# Altium footprint library custom.PcbLib: 330 footprints (part 1 of 21)
Each footprint in its own frame and in the unit in brackets; x right, y up, seen from the top. Pads: shape width x height; smd on the part's side, far side on the other; paste and mask are expansions set on the pad; w line width, h text height; cw(c..) or ccw(c..) is an arc to the next point about the centre after c.
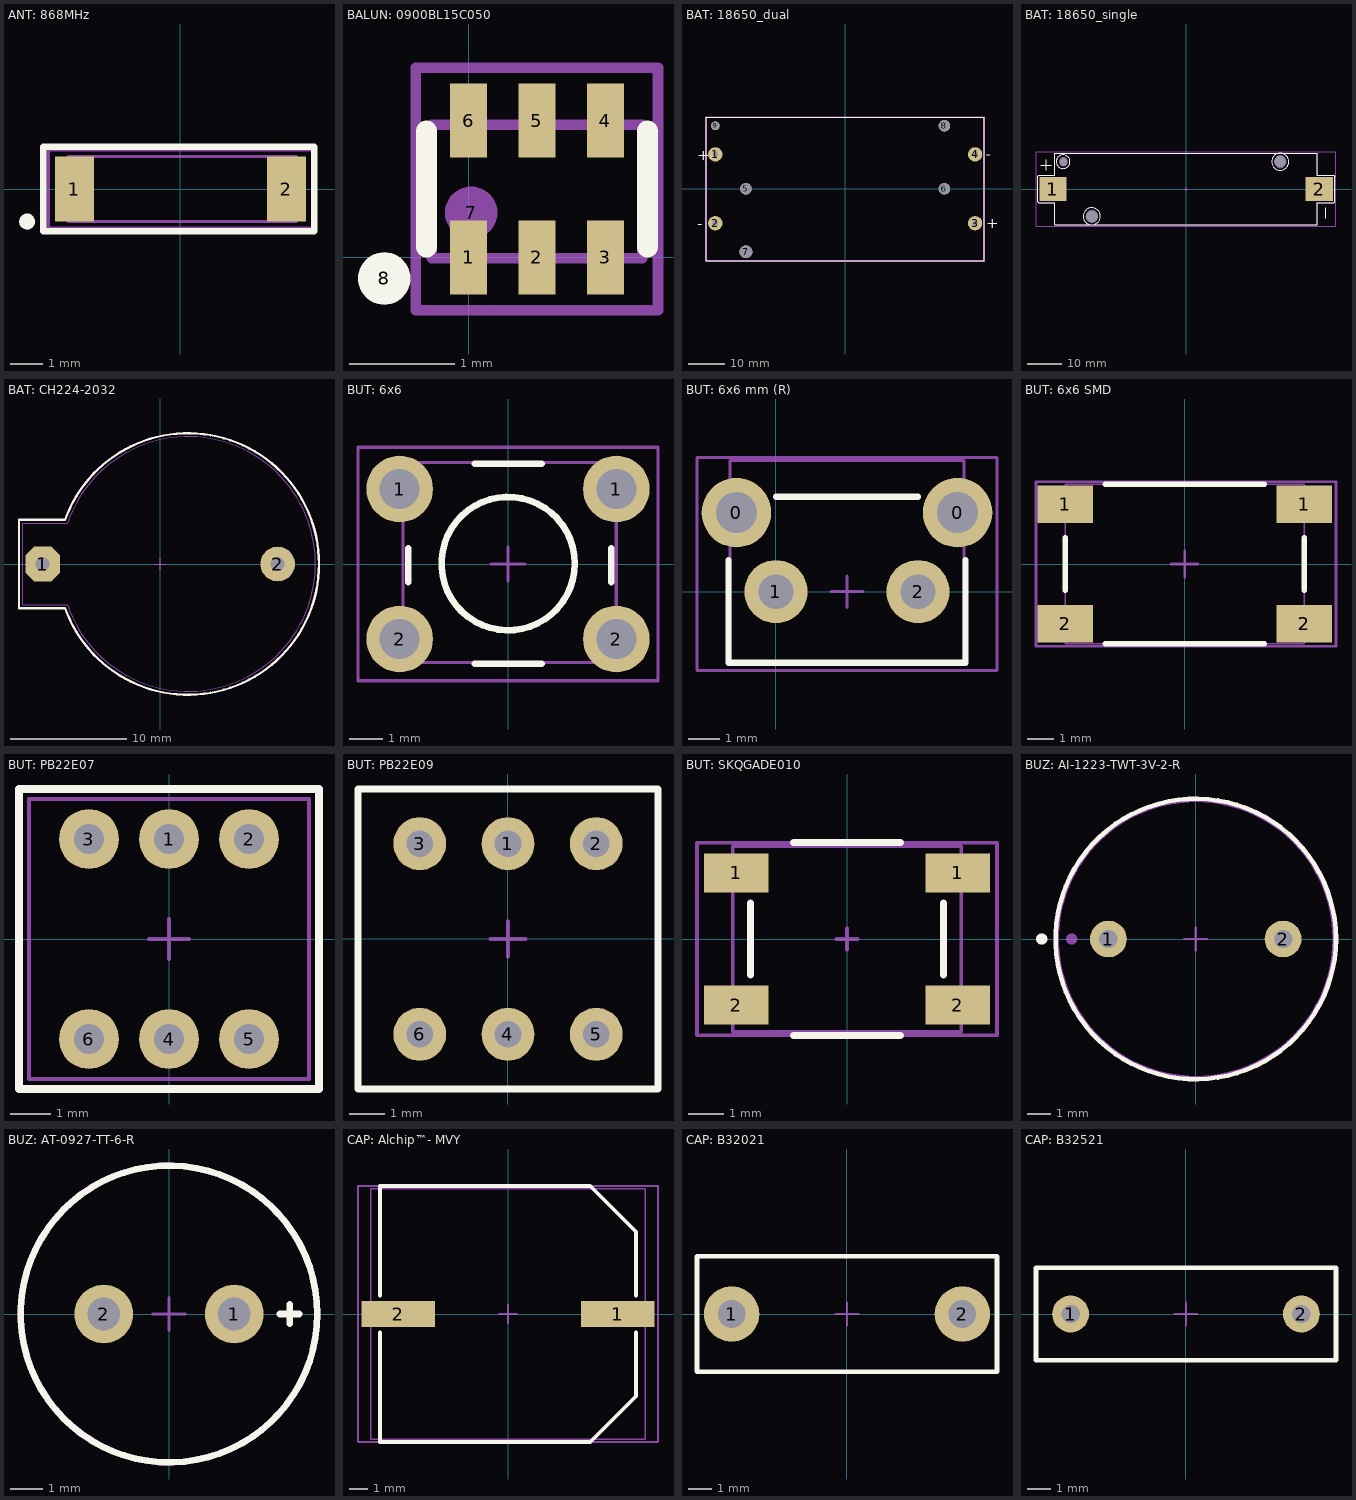
[diagram p0: the footprints below, top view; thin cyan lines are the x and y axes]

## ANT: 868MHz [mm]
height 1.2
pads (4):
  rect 1.2x2 smd: 1(-3.25,0) 2(3.25,0)
  round 0.5 on Top Overlay: ""(-4.7,-1)
  round 0.5 on Mech1: ""(-3.05,0.6)
Top Overlay:
  lines w0.2: -4.2,-1.3 -4.2,1.3 4.1,1.3 4.1,-1.3 -4.2,-1.3
Top Assy:
  lines w0.1: -3.45,-1 -3.45,1 3.55,1 3.55,-1 -3.45,-1
Size Area:
  lines w0.1: -4.05,-1.2 4.05,-1.2 4.05,1.2 -4.05,1.2 -4.05,-1.2
3D body "User Library-0868AT43A0020.STEP": height 0.8, standoff 0, extent -3.45,-1 3.55,1

## BALUN: 0900BL15C050 [mm]
pads (8):
  rect 0.35x0.7 smd: 1(0,0) 2(0.65,0) 3(1.3,0) 4(1.3,1.3) 5(0.65,1.3) 6(0,1.3)
  round 0.5 on Mech1: 7(0.025,0.425)
  round 0.5 on Top Overlay: 8(-0.8,-0.2)
Top Overlay:
  lines w0.2: -0.4,0.1 -0.4,1.2 ; 1.7,0.1 1.7,1.2
Top Assy:
  lines w0.1: -0.35,-0.01 1.65,-0.01 1.65,1.26 -0.35,1.26 -0.35,-0.01
Size Area:
  lines w0.1: -0.5,-0.5 1.8,-0.5 1.8,1.8 -0.5,1.8 -0.5,-0.5
3D body "User Library-1600BL15B100E.STEP": height 0.84, standoff -0.02, extent -0.35,-0.01 1.65,1.26

## BAT: 18650_dual [mm] "Holder for Dual 18650 Batteries P/N 1049"
height 20
pads (9):
  round 4 hole 1.5: 1(-36.11,9.565) 2(-36.11,-9.565) 3(36.11,-9.565) 4(36.11,9.565)
  round 3.2 hole 3.2: 5(-27.6,0) 6(27.6,0) 8(27.6,17.515)
  round 3.55 hole 3.55: 7(-27.6,-17.515)
  round 2.4 hole 2.4: 9(-36.11,17.515)
Top Overlay:
  lines w0.2: -38.6,-20 38.6,-20 38.6,19.9 -38.6,19.9 -38.6,-20
  text "-" at 39.1,8.2 h3
  text "+" at 39.2,-10.9 h3
  text "-" at -41.1,-11.1 h3
  text "+" at -41.2,8 h3
Top Assy:
  lines w0.05: -38.51,-19.923 38.546,-19.923 38.546,19.85 -38.51,19.85 -38.51,-19.923
  lines w0.1: -38.51,19.85 -38.51,-19.923 38.546,-19.923 38.546,19.85 38.543,19.853 -38.51,19.853
Size Area:
  lines w0.1: 38.256,20.1 -38.8,20.1 -38.8,-20.2 38.8,-20.2 38.8,20.1
3D body "keystone-PN1049.STEP": height 15.78, standoff -2.61, extent -38.51,-19.923 38.546,19.853

## BAT: 18650_single [mm]
height 22
pads (5):
  round 1.524 hole 2.4: 0(-35.93,8)
  round 1.524 hole 3.5: 0(-27.6,-8) 0(27.6,8)
  rect 8x7 smd: 1(-39,0) 2(39,0)
Top Overlay:
  circle w0.2: c-36,8 r2
  circle w0.2: c-27.6,-8 r2.5
  circle w0.2: c27.6,8 r2.5
  lines w0.2: -42.5,7 -39.5,7 ; -41,5.5 -41,8.5 ; 41,-8.5 41,-5.5 ; 43.5,-3.7 43.5,3.7 ; 43.5,-3.7 43.2,-4 38.5,-4 38.5,-10.5 -38.5,-10.5 -38.5,-4 -43.2,-4 -43.5,-3.7 -43.5,3.7 -43.2,4 -38.5,4 -38.5,10.5 38.5,10.5 38.5,4 43.2,4 43.5,3.7 ; 43.5,-3.7 43.5,3.7
Top Assy:
  circle w0.254: c27.6,8 r1.75
  circle w0.254: c-27.6,-8 r1.75
  circle w0.254: c-35.93,8 r1.2
  lines w0.1: -43.5,-3.7 -43.2,-4 -38.5,-4 -38.5,-10.5 38.5,-10.5 38.5,-4 43.2,-4 43.5,-3.7 43.5,3.7 43.2,4 38.5,4 38.5,10.5 -38.5,10.5 -38.5,4 -43.2,4 -43.5,3.7 -43.5,-3.7
Size Area:
  lines w0.1: -0.5,0 0.5,0 ; 0,-0.5 0,0.5 ; -43.953,-10.922 43.931,-10.922 43.931,10.922 -43.953,10.922 -43.953,-10.922
3D body "keystone-PN1042.STEP": height 15.01, standoff -3.28, extent -43,-10.35 43.004,10.3

## BAT: CH224-2032 [mm] "Батарейный отсек для элемента 2032"
height 9
pads (2):
  oct 3x3 hole 1.2: 1(-10.151,0)
  round 3 hole 1.2: 2(10.152,0)
Top Overlay:
  lines w0.2: -8.255,-3.81 -12.192,-3.81 -12.192,3.81 -8.255,3.81 ; -8.221,-3.798 ccw(c2.422,0) -8.221,3.798
Top Assy:
  lines w0.1: -7.992,-3.5 -11.848,-3.5 -11.848,3.5 -7.992,3.5 ; -7.989,-3.552 ccw(c2.422,0) -7.989,3.552
Size Area:
  lines w0.1: -8.255,-3.81 -12.192,-3.81 -12.192,3.81 -8.255,3.81 ; -8.221,-3.798 ccw(c2.422,0) -8.221,3.798 ; -0.5,0 0.5,0 ; 0,-0.5 0,0.5
3D body "CH224-2032.step": height 8.5, standoff -4, extent -11.079,-11 13.421,11

## BUT: 6x6 [mm] "Leaded Tactile Button 6x6"
height 5
pads (4):
  round 2 hole 1.2: 1(-3.25,2.25) 1(3.25,2.25) 2(-3.25,-2.25) 2(3.25,-2.25)
Top Overlay:
  circle w0.2: c0.004,0.012 r2
  lines w0.2: -2.996,-0.544 -2.996,0.472 ; -0.996,-2.988 1.004,-2.988 ; -0.996,3.012 1.004,3.012 ; 3.1,-0.544 3.1,0.472
Top Assy:
  lines w0.1: -3.148,-2.957 3.252,-2.957 3.252,3.043 -3.148,3.043 -3.148,-2.957
Size Area:
  lines w0.1: -0.5,0 0.5,0 ; 0,-0.5 0,0.5 ; -4.5,-3.5 -4.5,3.5 4.5,3.5 4.5,-3.5 -4.5,-3.5
3D body "кнопка_тактовая_6х6х1.STEP": height 4.5, standoff -0.9, extent -3.148,-2.957 3.252,3.043

## BUT: 6x6 mm (R) [mm]
height 7.4
pads (4):
  round 2.2 hole 1.3: 0(-1.25,2.5) 0(5.75,2.5)
  round 2 hole 1.1: 1(0,0) 2(4.5,0)
Top Overlay:
  lines w0.2: -1.5,1 -1.5,-2.25 6,-2.25 6,1 ; 0,3 4.5,3
Top Assy:
  lines w0.1: -1.45,-2.3 5.95,-2.3 5.95,4.15 -1.45,4.15 -1.45,-2.3
Size Area:
  lines w0.1: 1.75,0 2.25,0 ; 2.25,-0.5 2.25,0 ; 2.25,0.5 2.25,0 ; 2.75,0 2.25,0 ; -2.5,-2.5 7,-2.5 7,4.25 -2.5,4.25 -2.5,-2.5
3D body "User Library-SWITCH, TACTILE, RIGHT ANGLE, 12VDC, 50MA, 6_85MM ACTUATOR, WEALTH METAL TC-0244Z-1.STEP": height 7, standoff -4, extent -1.45,-6.85 5.95,4.15

## BUT: 6x6 SMD [mm] "Leaded Tactile Button 6x6"
height 9
pads (4):
  rect 2.1x1.4 smd: 1(-4.5,2.25) 1(4.5,2.25) 2(-4.5,-2.25) 2(4.5,-2.25)
Top Overlay:
  lines w0.2: -4.5,-1 -4.5,1 ; -3,-3 3,-3 ; -3,3 3,3 ; 4.5,-1 4.5,1
Top Assy:
  lines w0.05: -4.5,-3 -4.5,3 4.5,3 4.5,-3 -4.5,-3
Size Area:
  lines w0.1: -0.5,0 0.5,0 ; 0,-0.5 0,0.5 ; -5.6,-3.1 5.7,-3.1 5.7,3.1 -5.6,3.1 -5.6,-3.1
3D body "User Library-PTS645SL43SMTR92-LFS.STEP": height 4.3, standoff 0, extent -4.5,-3 4.5,3

## BUT: PB22E07 [mm] "DPDT, 7x7"
height 12.3
pads (6):
  round 1.5 hole 0.762: 1(0,2.5) 2(2,2.5) 3(-2,2.5) 4(0,-2.5) 5(2,-2.5) 6(-2,-2.5)
Top Overlay:
  lines w0.2: -3.75,-3.75 -3.75,3.75 3.75,3.75 3.75,-3.75 -3.75,-3.75
Top Assy:
  lines w0.1: -3.5,-3.5 -3.5,3.5 3.5,3.5 3.5,-3.5 -3.5,-3.5
Size Area:
  lines w0.1: -0.5,0 0.5,0 ; 0,-0.5 0,0.5 ; -3.75,-3.75 -3.75,3.75 3.75,3.75 3.75,-3.75 -3.75,-3.75
3D body "PB22E07.STEP": height 12.6, standoff -2, extent -3.5,-3.5 3.5,3.5

## BUT: PB22E09 [mm] "DPDT, 8.5x8.5x14"
height 14
pads (6):
  round 1.5 hole 0.762: 1(0,2.7) 2(2.5,2.7) 3(-2.5,2.7) 4(0,-2.7) 5(2.5,-2.7) 6(-2.5,-2.7)
Top Overlay:
  lines w0.2: -4.25,-4.25 4.25,-4.25 4.25,4.25 -4.25,4.25 -4.25,-4.25
Top Assy:
  lines w0.1: -4.25,-4.25 4.25,-4.25 4.25,4.25 -4.25,4.25 -4.25,-4.25
Size Area:
  lines w0.1: -0.5,0 0.5,0 ; 0,-0.5 0,0.5 ; -4.25,-4.25 -4.25,4.25 4.25,4.25 4.25,-4.25 -4.25,-4.25
3D body "PB22E09.STEP": height 14, standoff -2, extent -4.25,-4.25 4.25,4.25

## BUT: SKQGADE010 [mm]
pads (4):
  rect 1.8x1.1 smd: 1(-3.1,1.85) 1(3.1,1.85) 2(-3.1,-1.85) 2(3.1,-1.85)
Top Overlay:
  lines w0.2: -2.7,-1 -2.7,1 ; -1.5,-2.7 1.5,-2.7 ; -1.5,2.7 1.5,2.7 ; 2.7,-1 2.7,1
Top Assy:
  lines w0.1: -3.2,-2.6 3.2,-2.6 3.2,2.6 -3.2,2.6 -3.2,-2.6
Size Area:
  lines w0.1: -0.3,0 0.3,0 ; 0,-0.3 0,0.3 ; -4.2,-2.7 4.2,-2.7 4.2,2.7 -4.2,2.7 -4.2,-2.7
3D body "User Library-4x4_SMD_Switch.STEP": height 1.45, standoff -0.05, extent -3.2,-2.6 3.2,2.6

## BUZ: AI-1223-TWT-3V-2-R [mm]
pads (4):
  round 1.6 hole 0.8: 1(-3.8,0) 2(3.8,0)
  round 0.5 on Top Overlay: ""(-6.7,0)
  round 0.5 on Mech1: ""(-5.4,0)
Top Overlay:
  circle w0.2: c0,0 r6.1
Top Assy:
  circle w0.1: c0,0 r6
Size Area:
  circle w0.1: c0,0 r6
  lines w0.1: -0.5,0 0.5,0 ; 0,-0.5 0,0.5
3D body "AI-1223-TWT-3V-2-R.STEP": height 7.55, standoff -2, extent -6,-6 6,6

## BUZ: AT-0927-TT-6-R [mm]
pads (2):
  round 1.8 hole 1: 1(2,0) 2(-2,0)
Top Overlay:
  circle w0.2: c0,0 r4.55
  lines w0.2: 3.4,0 4,0 ; 3.7,-0.3 3.7,0.3
Top Assy:
  circle w0.1: c0,0 r4.5
  lines w0.1: 3.4,0 4,0 ; 3.7,-0.3 3.7,0.3
Size Area:
  circle w0.1: c0,0 r4.6
  lines w0.1: -0.5,0 0.5,0 ; 0,-0.5 0,0.5
3D body "AT-0927-TT-6-R.STEP": height 4.52, standoff -2.5, extent -4.5,-4.5 4.5,4.5

## CAP: Alchip™- MVY [mm]
pads (2):
  rect 4x1.4 smd: 1(6,0) 2(-6,0)
Top Overlay:
  lines w0.2: -7,-1 -7,-7 4.5,-7 7,-4.5 7,-1 ; -7,1 -7,7 4.5,7 7,4.5 7,1
Top Assy:
  lines w0.1: -6.5,0 -5.5,0 ; -6,-0.5 -6,0.5 ; -7.5,-6.85 -7.5,6.85 7.501,6.85 7.501,-6.85 -7.5,-6.85
Size Area:
  lines w0.1: -0.5,0 0.5,0 ; 0,-0.5 0,0.5 ; -8.2,-7 8.2,-7 8.2,7 -7.6,7 -8.2,7 -8.2,0 -8.2,-7
3D body "User Library-CAP_AL_EL_SMT_13x14.STEP": height 14, standoff 0, extent -7.5,-6.85 7.501,6.85

## CAP: B32021 [mm]
pads (2):
  round 2.4 hole 1.2: 1(-5,0) 2(5,0)
Top Overlay:
  lines w0.2: -6.5,-2.5 6.5,-2.5 6.5,2.5 -6.5,2.5 -6.5,-2.5
Top Assy:
  lines w0.1: -6.5,-2.5 6.5,-2.5 6.5,2.5 -6.5,2.5 -6.5,-2.5
Size Area:
  lines w0.1: -0.5,0 0.5,0 ; 0,-0.5 0,0.5 ; -6.5,-2.5 -6.5,2.5 6.5,2.5 6.5,-2.5 -6.5,-2.5
3D body "CAPRR1000W60L1300T500H1100.STEP": height 10.7, standoff -2.75, extent -6.5,-2.5 6.5,2.5

## CAP: B32521 [mm]
pads (2):
  round 1.6 hole 0.8: 1(-5,0) 2(5,0)
Top Overlay:
  lines w0.2: -6.5,-2 -6.5,2 6.5,2 6.5,-2 -6.5,-2
Top Assy:
  lines w0.1: -6.5,-2 6.5,-2 6.5,2 -6.5,2 -6.5,-2
Size Area:
  lines w0.1: -0.5,0 0.5,0 ; 0,-0.5 0,0.5 ; -6.5,-2 6.5,-2 6.5,2 -6.5,2 -6.5,-2
3D body "B32521.STEP": height 9, standoff -3, extent -6.5,-2 6.5,2